# Altium footprint library rescap.PcbLib: 106 footprints (part 6 of 7)
Each footprint in its own frame and in the unit in brackets; x right, y up, seen from the top. Pads: shape width x height; smd on the part's side, far side on the other; paste and mask are expansions set on the pad; w line width, h text height; cw(c..) or ccw(c..) is an arc to the next point about the centre after c.
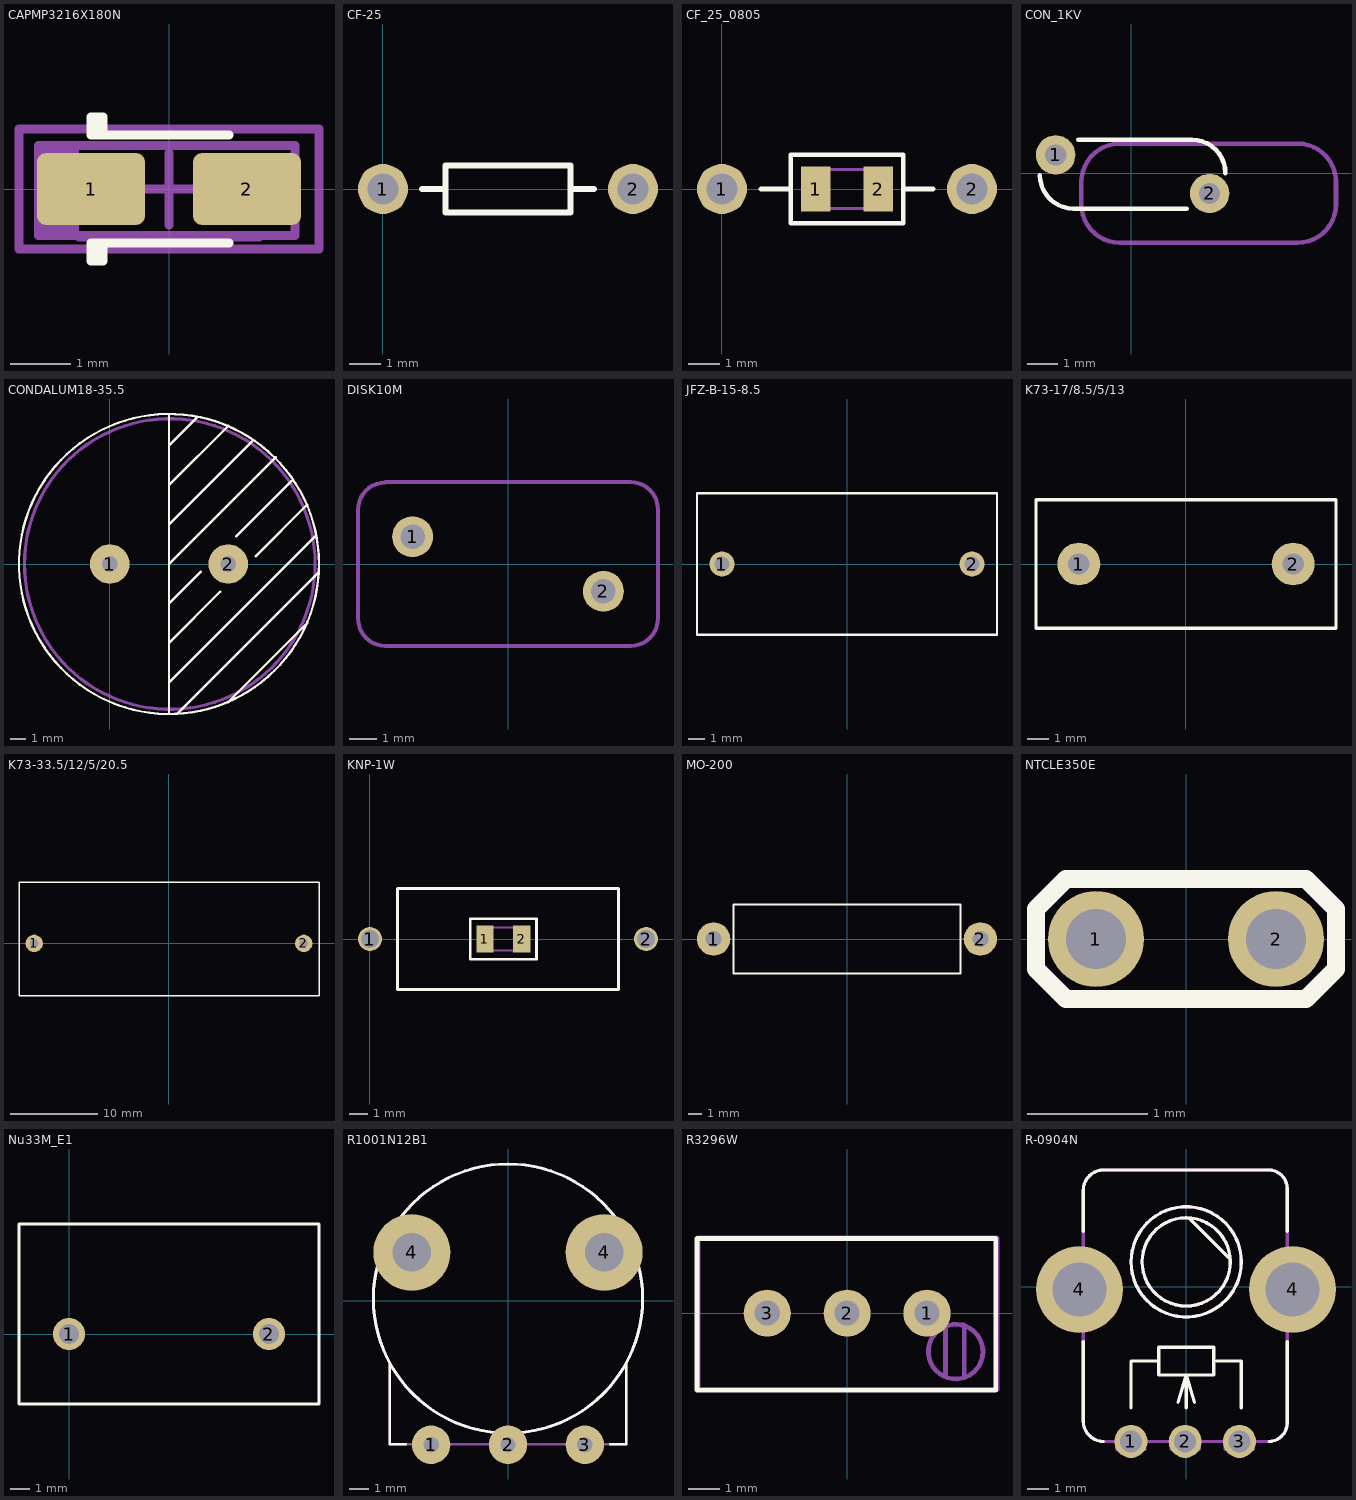
[diagram p5: the footprints below, top view; thin cyan lines are the x and y axes]

## CAPMP3216X180N [mm] "Capacitor, polarized, Molded Body, EIA 535BAAC size A; 3.20mm L X 1.60mm W X 1.80mm H"
height 1.8
pads (2):
  rrect25% 1.8x1.2 smd: 1(-1.3,0) 2(1.3,0)
Top Overlay:
  lines w0.15: -1.2,-1.2 -1.2,-0.9 ; -1.2,0.9 -1.2,1.2 ; -1.1,-0.9 -1.1,-1.2 -1.3,-1.2 -1.3,-0.9 1,-0.9 ; -1.1,0.9 -1.1,1.2 -1.3,1.2 -1.3,0.9 1,0.9
Top Courtyard:
  lines w0.15: -0.6,0 0,0 ; 0,-0.6 0,0 ; 0,0.6 0,0 ; 0.6,0 0,0 ; -2.5,-1 -2.5,1 2.5,1 2.5,-1 -2.5,-1
Mechanical 29:
  rectangle: -2.175,-0.775 -1.5,0.725
  lines w0.15: -1.5,-0.8 1.5,-0.8 ; -2.175,-0.775 2.1,-0.775 2.1,0.725 -2.175,0.725 -2.175,-0.775
  text ".Designator" at -1.4,-0.4 h1
3D body "CAPMP3216X180N.STEP": height 1.8, standoff 0, extent -1.6,-0.8 1.6,0.8

## CF-25 [mm]
pads (2):
  round 1.6 hole 1 unplated: 1(0,0) 2(8,0)
Top Overlay:
  lines w0.2: 1.25,0 2,0 ; 6,0 6.75,0 ; 2,-0.75 2,0.75 6,0.75 6,-0.75 2,-0.75

## CF_25_0805 [mm]
pads (4):
  round 1.6 hole 1 unplated: 1(0,0) 2(8,0)
  rect 0.95x1.45 smd: 1(3,0) 2(5,0)
Top Overlay:
  lines w0.15: 1.25,0 2.2,0 ; 5.8,0 6.75,0 ; 2.2,-1.1 2.2,1.1 5.8,1.1 5.8,-1.1 2.2,-1.1
Mechanical 13:
  lines w0.1: 2.975,-0.625 2.975,0.625 5.025,0.625 5.025,-0.625 2.975,-0.625
3D body "CRCW08051R20JNEA.stp": height 0.5, standoff 0, extent 2.975,-0.625 5.025,0.625

## CON_1KV [mm]
pads (2):
  round 1.3 hole 0.7: 1(-2.5,0.6) 2(2.58,-0.67)
Top Overlay:
  lines w0.15: -3.02,-0.07 ccw(c-1.92,-0.07) -1.92,-1.17 1.83,-1.17 ; -1.75,1.1 2,1.1 cw(c2,0) 3.1,0
Mechanical 29:
  lines w0.15: -1.65,-1.03 ccw(c-0.38,-1.03) -0.38,-2.3 -0.15,-2.3 5.48,-2.3 ccw(c5.48,-1.03) 6.75,-1.03 6.75,-0.295 ccw(c5.48,-0.295) 5.48,0.975 -0.38,0.975 ccw(c-0.38,-0.295) -1.65,-0.295 -1.65,-1.03
  text ".Designator" at -0.2,-0.9 h1
3D body "CAPS6mm.STEP": height 6.1, standoff -3, extent -2.775,-0.95 2.825,0.85

## CONDALUM18-35.5 [mm]
pads (2):
  round 2.5 hole 1: 1(0,0) 2(7.5,0)
Top Overlay:
  circle w0.15: c3.75,0 r9.5
  lines w0.15: 3.75,-9.5 3.75,9.5 ; 3.75,-7.5 13,1.75 ; 3.75,-5 7,-1.75 ; 3.75,-2.5 5.75,-0.5 ; 3.75,0 10.5,6.75 ; 3.75,2.5 9,7.75 ; 3.75,5 7.5,8.75 ; 3.75,7.5 5.5,9.25 ; 4.25,-9.5 13.25,-0.5 ; 7.5,-8.75 12.5,-3.75 ; 8,1.75 11.5,5.25 ; 9.25,0.5 12.5,3.75
Top Courtyard:
  circle w0.2: c3.8,0 r9.202
3D body "cap.STEP": height 35.55, standoff -3.1, extent -6.699,-10.41 14.202,10.448

## DISK10M [mm]
pads (2):
  round 1.5 hole 0.9: 1(-3.5,1) 2(3.5,-1)
Top Courtyard:
  lines w0.15: -5.5,-2 ccw(c-4.5,-2) -4.5,-3 4.5,-3 ccw(c4.5,-2) 5.5,-2 ; -5.5,-1.989 -5.5,2 ; -5.5,1.989 cw(c-4.5,1.989) -4.5,2.989 ; -4.5,3 4.5,3 cw(c4.5,2) 5.5,2 ; 5.5,-1.989 5.5,1.989

## JFZ-B-15-8.5 [mm]
pads (2):
  round 1.5 hole 0.9: 1(-7.5,0) 2(7.5,0)
Top Overlay:
  lines w0.15: -9,-4.25 -9,4.25 -7.5,4.25 7.5,4.25 9,4.25 9,-4.25 7.5,-4.25 -7.5,-4.25 -9,-4.25
3D body: height 14, standoff 0.5, extent -9,-4.3 9,4.2

## K73-17/8.5/5/13 [mm]
pads (2):
  round 2 hole 1: 1(-5,0) 2(5,0)
Top Overlay:
  lines w0.15: -7,-3 7,-3 7,3 -7,3 -7,-3
3D body: height 8.5, standoff 0, extent -6.5,-2.5 6.5,2.5

## K73-33.5/12/5/20.5 [mm]
pads (2):
  round 2 hole 1: 1(-15.5,0) 2(15.5,0)
Top Overlay:
  lines w0.15: -17.25,-6 17.25,-6 17.25,7 -17.25,7 -17.25,-6
3D body: height 20.5, standoff 0, extent -16.75,-5.5 16.75,6.5

## KNP-1W [mm]
pads (4):
  round 1.3 hole 1: 1(0,0) 2(15,0)
  rect 0.95x1.45 smd: 1(6.25,0) 2(8.25,0)
Top Overlay:
  lines w0.15: 1.5,-2.75 13.5,-2.75 13.5,2.75 1.5,2.75 1.5,-2.75 ; 5.45,-1.1 5.45,1.1 9.05,1.1 9.05,-1.1 5.45,-1.1
Mechanical 13:
  lines w0.1: 6.225,-0.625 6.225,0.625 8.275,0.625 8.275,-0.625 6.225,-0.625
3D body "CRCW08051R20JNEA.stp": height 0.5, standoff 0, extent 6.225,-0.625 8.275,0.625

## MO-200 [mm]
pads (2):
  round 2.5 hole 1.2: 1(-10,0) 2(10,0)
Top Overlay:
  lines w0.15: -8.5,-2.6 8.5,-2.6 8.5,2.6 -8.5,2.6 -8.5,-2.6
3D body: height 5, standoff 0, extent -7.5,-2.5 7.5,2.5

## NTCLE350E [mm]
pads (2):
  round 0.8 hole 0.5: 1(-0.75,0) 2(0.75,0)
Top Overlay:
  lines w0.15: -1.25,-0.25 -1,-0.5 1,-0.5 1.25,-0.25 1.25,0.25 1,0.5 -1,0.5 -1.25,0.25 -1.25,-0.25
Top Courtyard:
  lines w0.15: -1.25,-0.25 -1,-0.5 1,-0.5 1.25,-0.25 1.25,0.25 1,0.5 -1,0.5 -1.25,0.25 -1.25,-0.25

## Nu33M_E1 [mm]
pads (2):
  round 1.6 hole 1: 1(0,0) 2(10,0)
Top Overlay:
  lines w0.15: -2.5,-3.5 12.5,-3.5 12.5,5.5 -2.5,5.5 -2.5,-3.5

## R1001N12B1 [mm]
pads (5):
  round 2 hole 0.8: 1(-4,-7.5) 2(0,-7.5) 3(4,-7.5)
  round 4 hole 2: 4(-5,2.5) 4(5,2.5)
Top Overlay:
  circle w0.15: c0,0.1 r7
  lines w0.15: -6.15,-3.25 -6.15,-7.475 -5.325,-7.475 ; 5.325,-7.475 6.15,-7.475 6.15,-3.25
Mechanical 29:
  circle w0.15: c0,0.1 r7
  lines w0.15: -6.15,-3.25 -6.15,-7.475 6.15,-7.475 6.15,-3.25
  text ".Designator" at -2.6,-0.1 h1
3D body "R1001N12B1.STEP": height 2.4, standoff -2.4, extent -7,-7.5 7,7.1

## R3296W [mm]
height 13
pads (3):
  round 1.5 hole 0.8: 1(2.54,0) 2(0,0) 3(-2.54,0)
Top Overlay:
  lines w0.15: -4.775,-2.45 4.725,-2.45 4.725,2.375 -4.775,2.375 -4.775,-2.45
Mechanical 29:
  circle w0.15: c3.45,-1.225 r0.868
  lines w0.15: 3.125,-2 3.125,-0.375 3.2,-0.375 ; 3.675,-0.375 3.725,-0.375 3.725,-2.05 ; -4.735,-2.43 4.765,-2.43 4.765,2.395 -4.735,2.395 -4.735,-2.43
  text ".Designator" at -3.3,-0.1 h1
3D body "3296W.STEP": height 11.52, standoff -3, extent -4.765,-2.43 4.765,2.4

## R-0904N [mil] "пїЅпїЅпїЅпїЅпїЅпїЅпїЅпїЅпїЅпїЅ пїЅпїЅпїЅпїЅпїЅпїЅпїЅпїЅ"
height 1377.95
pads (5):
  round 60 hole 40: 1(-100.28,-280.59) 2(-1.85,-280.59) 3(96.57,-280.59)
  round 157.48 hole 98.43: 4(-193.7,-5)
  round 157.48 hole 98.42: 4(193,-5)
Top Overlay:
  circle w5.91: c0,45 r100
  circle w5.91: c0,45 r80
  lines w5.91: -186.89,-100 -186.89,-243.7 ccw(c-150,-243.7) -150,-280.59 ; -186.89,100 -186.89,175 ; -186.89,174.65 cw(c-150,174.65) -150,211.54 150,211.54 cw(c150,178.35) 183.19,178.35 183.19,100 ; -100,-220 -100,-135 -50,-135 ; -15,-210 0,-160 ; 0,-220 0,-160 ; 7.5,122.5 77.5,52.5 ; 15,-210 0,-160 ; 55,-135 100,-135 100,-198.75 100,-220 ; 150,-280.59 ccw(c150,-247.4) 183.19,-247.4 183.19,-100 ; -50,-160 50,-160 50,-110 -50,-110 -50,-160
Mechanical 29:
  circle w5.91: c0,45 r100
  circle w5.91: c0,45 r80
  lines w5.91: -186.89,-59.06 -201.57,-59.06 -224.17,-59.06 -224.17,47.24 -186.89,47.24 ; -186.89,174.65 cw(c-150,174.65) -150,211.54 150,211.54 cw(c150,178.35) 183.19,178.35 183.19,-100 183.19,-247.4 cw(c150,-247.4) 150,-280.59 -150,-280.59 cw(c-150,-243.7) -186.89,-243.7 -186.89,-100 -186.89,175 ; -125.98,-280.59 -125.98,-295.28 -74.8,-295.28 -74.8,-280.59 ; -27.56,-280.59 -27.56,-295.28 23.62,-295.28 23.62,-280.59 ; 7.5,122.5 77.5,52.5 ; 70.87,-280.59 70.87,-295.28 122.05,-295.28 122.05,-280.59 ; 183.19,-59.06 197.87,-59.06 220.47,-59.06 220.47,47.24 183.19,47.24
  text ".Designator" at -145.67,-173.23 h39.37
3D body "Potenciometr.stp": height 1267.72, standoff -181.1, extent -209.37,-290 208.61,242.01